# Altium schematic symbol library Regulator_Linear.SchLib: 1538 symbols (part 9 of 9) (continued)
## TPS76329 (continued)
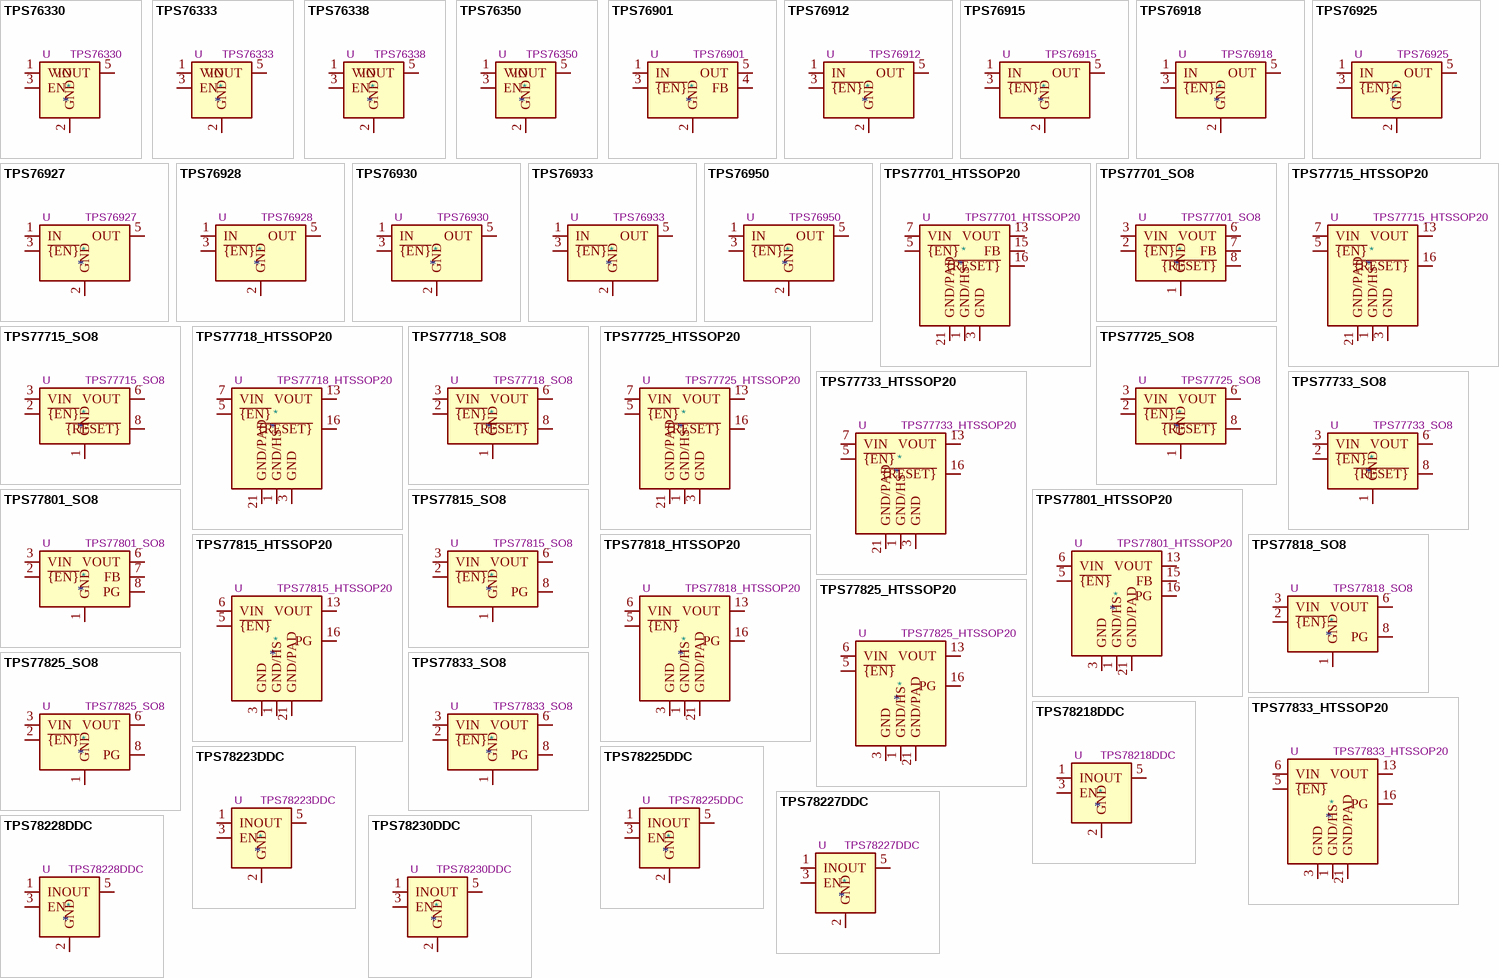
[diagram p37: symbols TPS76330 to TPS78230DDC]

## TPS76330
designator *  value TPS76330  Reference: U
ki_keywords: linear low dropout Regulator fixed; ki_description: Low power 150mA LDO 3.0V fixed output voltage, SOT-23-5; ki_fp_filters: SOT?23*; Footprint: Package_TO_SOT_SMD:SOT-23-5; Datasheet: http://www.ti.com/lit/ds/symlink/tps763.pdf
pins: 1 VIN, 2 GND, 3 EN, 4 NC hidden, 5 VOUT

## TPS76333
designator *  value TPS76333  Reference: U
ki_keywords: linear low dropout Regulator fixed; ki_description: Low power 150mA LDO 3.3V fixed output voltage, SOT-23-5; ki_fp_filters: SOT?23*; Footprint: Package_TO_SOT_SMD:SOT-23-5; Datasheet: http://www.ti.com/lit/ds/symlink/tps763.pdf
pins: 1 VIN, 2 GND, 3 EN, 4 NC hidden, 5 VOUT

## TPS76338
designator *  value TPS76338  Reference: U
ki_keywords: linear low dropout Regulator fixed; ki_description: Low power 150mA LDO 3.8V fixed output voltage, SOT-23-5; ki_fp_filters: SOT?23*; Footprint: Package_TO_SOT_SMD:SOT-23-5; Datasheet: http://www.ti.com/lit/ds/symlink/tps763.pdf
pins: 1 VIN, 2 GND, 3 EN, 4 NC hidden, 5 VOUT

## TPS76350
designator *  value TPS76350  Reference: U
ki_keywords: linear low dropout Regulator fixed; ki_description: Low power 150mA LDO 5.0V fixed output voltage, SOT-23-5; ki_fp_filters: SOT?23*; Footprint: Package_TO_SOT_SMD:SOT-23-5; Datasheet: http://www.ti.com/lit/ds/symlink/tps763.pdf
pins: 1 VIN, 2 GND, 3 EN, 4 NC hidden, 5 VOUT

## TPS76901
designator *  value TPS76901  Reference: U
ki_keywords: Ultra Low Power Adjustable LDO 100mA; ki_description: Ultra Low Power 100mA Low Drop Adjustable Out Regulator, SOT-23-5; ki_fp_filters: SOT?23*; Footprint: Package_TO_SOT_SMD:SOT-23-5; Datasheet: http://www.ti.com/lit/ds/symlink/tps769.pdf
pins: 1 IN, 2 GND, 3 ~{{EN}}, 4 FB, 5 OUT

## TPS76912
designator *  value TPS76912  Reference: U
ki_keywords: Ultra Low Power Fixed LDO 100mA; ki_description: Ultra Low Power 100mA Low Drop Out Regulator 1.2V, SOT-23-5; ki_fp_filters: SOT?23*; Footprint: Package_TO_SOT_SMD:SOT-23-5; Datasheet: http://www.ti.com/lit/ds/symlink/tps769.pdf
pins: 1 IN, 2 GND, 3 ~{{EN}}, 4 NC hidden, 5 OUT

## TPS76915
designator *  value TPS76915  Reference: U
ki_keywords: Ultra Low Power Fixed LDO 100mA; ki_description: Ultra Low Power 100mA Low Drop Out Regulator 1.5V, SOT-23-5; ki_fp_filters: SOT?23*; Footprint: Package_TO_SOT_SMD:SOT-23-5; Datasheet: http://www.ti.com/lit/ds/symlink/tps769.pdf
pins: 1 IN, 2 GND, 3 ~{{EN}}, 4 NC hidden, 5 OUT

## TPS76918
designator *  value TPS76918  Reference: U
ki_keywords: Ultra Low Power Fixed LDO 100mA; ki_description: Ultra Low Power 100mA Low Drop Out Regulator 1.8V, SOT-23-5; ki_fp_filters: SOT?23*; Footprint: Package_TO_SOT_SMD:SOT-23-5; Datasheet: http://www.ti.com/lit/ds/symlink/tps769.pdf
pins: 1 IN, 2 GND, 3 ~{{EN}}, 4 NC hidden, 5 OUT

## TPS76925
designator *  value TPS76925  Reference: U
ki_keywords: Ultra Low Power Fixed LDO 100mA; ki_description: Ultra Low Power 100mA Low Drop Out Regulator 2.5V, SOT-23-5; ki_fp_filters: SOT?23*; Footprint: Package_TO_SOT_SMD:SOT-23-5; Datasheet: http://www.ti.com/lit/ds/symlink/tps769.pdf
pins: 1 IN, 2 GND, 3 ~{{EN}}, 4 NC hidden, 5 OUT

## TPS76927
designator *  value TPS76927  Reference: U
ki_keywords: Ultra Low Power Fixed LDO 100mA; ki_description: Ultra Low Power 100mA Low Drop Out Regulator 2.7V, SOT-23-5; ki_fp_filters: SOT?23*; Footprint: Package_TO_SOT_SMD:SOT-23-5; Datasheet: http://www.ti.com/lit/ds/symlink/tps769.pdf
pins: 1 IN, 2 GND, 3 ~{{EN}}, 4 NC hidden, 5 OUT

## TPS76928
designator *  value TPS76928  Reference: U
ki_keywords: Ultra Low Power Fixed LDO 100mA; ki_description: Ultra Low Power 100mA Low Drop Out Regulator 2.8V, SOT-23-5; ki_fp_filters: SOT?23*; Footprint: Package_TO_SOT_SMD:SOT-23-5; Datasheet: http://www.ti.com/lit/ds/symlink/tps769.pdf
pins: 1 IN, 2 GND, 3 ~{{EN}}, 4 NC hidden, 5 OUT

## TPS76930
designator *  value TPS76930  Reference: U
ki_keywords: Ultra Low Power Fixed LDO 100mA; ki_description: Ultra Low Power 100mA Low Drop Out Regulator 3.0V, SOT-23-5; ki_fp_filters: SOT?23*; Footprint: Package_TO_SOT_SMD:SOT-23-5; Datasheet: http://www.ti.com/lit/ds/symlink/tps769.pdf
pins: 1 IN, 2 GND, 3 ~{{EN}}, 4 NC hidden, 5 OUT

## TPS76933
designator *  value TPS76933  Reference: U
ki_keywords: Ultra Low Power Fixed LDO 100mA; ki_description: Ultra Low Power 100mA Low Drop Out Regulator 3.3V, SOT-23-5; ki_fp_filters: SOT?23*; Footprint: Package_TO_SOT_SMD:SOT-23-5; Datasheet: http://www.ti.com/lit/ds/symlink/tps769.pdf
pins: 1 IN, 2 GND, 3 ~{{EN}}, 4 NC hidden, 5 OUT

## TPS76950
designator *  value TPS76950  Reference: U
ki_keywords: Ultra Low Power Fixed LDO 100mA 5V; ki_description: Ultra Low Power 100mA Low Drop Out Regulator 5.0V, SOT-23-5; ki_fp_filters: SOT?23*; Footprint: Package_TO_SOT_SMD:SOT-23-5; Datasheet: http://www.ti.com/lit/ds/symlink/tps769.pdf
pins: 1 IN, 2 GND, 3 ~{{EN}}, 4 NC hidden, 5 OUT

## TPS77701_HTSSOP20
designator *  value TPS77701_HTSSOP20  Reference: U
ki_keywords: 750mA LDO Regulator Adjustable Positive; ki_description: 750mA Fast-Transient Low Dropout Voltage Regulator, Adjustable Output 1.5-5.5V, HTSSOP20; ki_fp_filters: HTSSOP*4.4x6.5mm*P0.65mm*; Footprint: Package_SO:HTSSOP-20-1EP_4.4x6.5mm_P0.65mm_EP3.4x6.5mm_ThermalVias; Datasheet: http://www.ti.com/lit/ds/symlink/tps777.pdf
pins: 1 GND/HS, 2 GND/HS hidden, 3 GND, 4 NC hidden, 5 ~{{EN}}, 6 VIN hidden, 7 VIN, 8 NC hidden, 9 GND/HS hidden, 10 GND/HS hidden, 11 GND/HS hidden, 12 GND/HS hidden, 13 VOUT, 14 VOUT hidden, 15 FB, 16 ~{{RESET}}, 17 NC hidden, 18 NC hidden, 19 GND/HS hidden, 20 GND/HS hidden, 21 GND/PAD

## TPS77701_SO8
designator *  value TPS77701_SO8  Reference: U
ki_keywords: 750mA LDO Regulator Adjustable Positive; ki_description: 750mA Fast-Transient Low Dropout Voltage Regulator, Adjustable Output 1.5-5.5V, SO-8; ki_fp_filters: SOIC*3.9x4.9mm*P1.27mm*; Footprint: Package_SO:SOIC-8_3.9x4.9mm_P1.27mm; Datasheet: http://www.ti.com/lit/ds/symlink/tps777.pdf
pins: 1 GND, 2 ~{{EN}}, 3 VIN, 4 VIN hidden, 5 VOUT hidden, 6 VOUT, 7 FB, 8 ~{{RESET}}

## TPS77715_HTSSOP20
designator *  value TPS77715_HTSSOP20  Reference: U
ki_keywords: 750mA LDO Regulator Fixed Positive; ki_description: 750mA Fast-Transient Low Dropout Voltage Regulator, Fixed Output 1.5V, HTSSOP20; ki_fp_filters: HTSSOP*4.4x6.5mm*P0.65mm*; Footprint: Package_SO:HTSSOP-20-1EP_4.4x6.5mm_P0.65mm_EP3.4x6.5mm_ThermalVias; Datasheet: http://www.ti.com/lit/ds/symlink/tps777.pdf
pins: 1 GND/HS, 2 GND/HS hidden, 3 GND, 4 NC hidden, 5 ~{{EN}}, 6 VIN hidden, 7 VIN, 8 NC hidden, 9 GND/HS hidden, 10 GND/HS hidden, 11 GND/HS hidden, 12 GND/HS hidden, 13 VOUT, 14 VOUT hidden, 15 NC hidden, 16 ~{{RESET}}, 17 NC hidden, 18 NC hidden, 19 GND/HS hidden, 20 GND/HS hidden, 21 GND/PAD

## TPS77715_SO8
designator *  value TPS77715_SO8  Reference: U
ki_keywords: 750mA LDO Regulator Fixed Positive; ki_description: 750mA Fast-Transient Low Dropout Voltage Regulator, Fixed Output 1.5V, SO-8; ki_fp_filters: SOIC*3.9x4.9mm*P1.27mm*; Footprint: Package_SO:SOIC-8_3.9x4.9mm_P1.27mm; Datasheet: http://www.ti.com/lit/ds/symlink/tps777.pdf
pins: 1 GND, 2 ~{{EN}}, 3 VIN, 4 VIN hidden, 5 VOUT hidden, 6 VOUT, 7 NC hidden, 8 ~{{RESET}}

## TPS77718_HTSSOP20
designator *  value TPS77718_HTSSOP20  Reference: U
ki_keywords: 750mA LDO Regulator Fixed Positive; ki_description: 750mA Fast-Transient Low Dropout Voltage Regulator, Fixed Output 1.8V, HTSSOP20; ki_fp_filters: HTSSOP*4.4x6.5mm*P0.65mm*; Footprint: Package_SO:HTSSOP-20-1EP_4.4x6.5mm_P0.65mm_EP3.4x6.5mm_ThermalVias; Datasheet: http://www.ti.com/lit/ds/symlink/tps777.pdf
pins: 1 GND/HS, 2 GND/HS hidden, 3 GND, 4 NC hidden, 5 ~{{EN}}, 6 VIN hidden, 7 VIN, 8 NC hidden, 9 GND/HS hidden, 10 GND/HS hidden, 11 GND/HS hidden, 12 GND/HS hidden, 13 VOUT, 14 VOUT hidden, 15 NC hidden, 16 ~{{RESET}}, 17 NC hidden, 18 NC hidden, 19 GND/HS hidden, 20 GND/HS hidden, 21 GND/PAD

## TPS77718_SO8
designator *  value TPS77718_SO8  Reference: U
ki_keywords: 750mA LDO Regulator Fixed Positive; ki_description: 750mA Fast-Transient Low Dropout Voltage Regulator, Fixed Output 1.8V, SO-8; ki_fp_filters: SOIC*3.9x4.9mm*P1.27mm*; Footprint: Package_SO:SOIC-8_3.9x4.9mm_P1.27mm; Datasheet: http://www.ti.com/lit/ds/symlink/tps777.pdf
pins: 1 GND, 2 ~{{EN}}, 3 VIN, 4 VIN hidden, 5 VOUT hidden, 6 VOUT, 7 NC hidden, 8 ~{{RESET}}

## TPS77725_HTSSOP20
designator *  value TPS77725_HTSSOP20  Reference: U
ki_keywords: 750mA LDO Regulator Fixed Positive; ki_description: 750mA Fast-Transient Low Dropout Voltage Regulator, Fixed Output 2.5V, HTSSOP20; ki_fp_filters: HTSSOP*4.4x6.5mm*P0.65mm*; Footprint: Package_SO:HTSSOP-20-1EP_4.4x6.5mm_P0.65mm_EP3.4x6.5mm_ThermalVias; Datasheet: http://www.ti.com/lit/ds/symlink/tps777.pdf
pins: 1 GND/HS, 2 GND/HS hidden, 3 GND, 4 NC hidden, 5 ~{{EN}}, 6 VIN hidden, 7 VIN, 8 NC hidden, 9 GND/HS hidden, 10 GND/HS hidden, 11 GND/HS hidden, 12 GND/HS hidden, 13 VOUT, 14 VOUT hidden, 15 NC hidden, 16 ~{{RESET}}, 17 NC hidden, 18 NC hidden, 19 GND/HS hidden, 20 GND/HS hidden, 21 GND/PAD

## TPS77725_SO8
designator *  value TPS77725_SO8  Reference: U
ki_keywords: 750mA LDO Regulator Fixed Positive; ki_description: 750mA Fast-Transient Low Dropout Voltage Regulator, Fixed Output 2.5V, SO-8; ki_fp_filters: SOIC*3.9x4.9mm*P1.27mm*; Footprint: Package_SO:SOIC-8_3.9x4.9mm_P1.27mm; Datasheet: http://www.ti.com/lit/ds/symlink/tps777.pdf
pins: 1 GND, 2 ~{{EN}}, 3 VIN, 4 VIN hidden, 5 VOUT hidden, 6 VOUT, 7 NC hidden, 8 ~{{RESET}}

## TPS77733_HTSSOP20
designator *  value TPS77733_HTSSOP20  Reference: U
ki_keywords: 750mA LDO Regulator Fixed Positive; ki_description: 750mA Fast-Transient Low Dropout Voltage Regulator, Fixed Output 3.3V, HTSSOP20; ki_fp_filters: HTSSOP*4.4x6.5mm*P0.65mm*; Footprint: Package_SO:HTSSOP-20-1EP_4.4x6.5mm_P0.65mm_EP3.4x6.5mm_ThermalVias; Datasheet: http://www.ti.com/lit/ds/symlink/tps777.pdf
pins: 1 GND/HS, 2 GND/HS hidden, 3 GND, 4 NC hidden, 5 ~{{EN}}, 6 VIN hidden, 7 VIN, 8 NC hidden, 9 GND/HS hidden, 10 GND/HS hidden, 11 GND/HS hidden, 12 GND/HS hidden, 13 VOUT, 14 VOUT hidden, 15 NC hidden, 16 ~{{RESET}}, 17 NC hidden, 18 NC hidden, 19 GND/HS hidden, 20 GND/HS hidden, 21 GND/PAD

## TPS77733_SO8
designator *  value TPS77733_SO8  Reference: U
ki_keywords: 750mA LDO Regulator Fixed Positive; ki_description: 750mA Fast-Transient Low Dropout Voltage Regulator, Fixed Output 3.3V, SO-8; ki_fp_filters: SOIC*3.9x4.9mm*P1.27mm*; Footprint: Package_SO:SOIC-8_3.9x4.9mm_P1.27mm; Datasheet: http://www.ti.com/lit/ds/symlink/tps777.pdf
pins: 1 GND, 2 ~{{EN}}, 3 VIN, 4 VIN hidden, 5 VOUT hidden, 6 VOUT, 7 NC hidden, 8 ~{{RESET}}

## TPS77801_HTSSOP20
designator *  value TPS77801_HTSSOP20  Reference: U
ki_keywords: 750mA LDO Regulator Adjustable Positive; ki_description: 750mA Fast-Transient Low Dropout Voltage Regulator, Adjustable Output 1.2-5.5V, HTSSOP20; ki_fp_filters: HTSSOP*4.4x6.5mm*P0.65mm*; Footprint: Package_SO:HTSSOP-20-1EP_4.4x6.5mm_P0.65mm_EP3.4x6.5mm_ThermalVias; Datasheet: http://www.ti.com/lit/ds/symlink/tps777.pdf
pins: 1 GND/HS, 2 GND/HS hidden, 3 GND, 4 NC hidden, 5 ~{{EN}}, 6 VIN, 7 VIN hidden, 8 NC hidden, 9 GND/HS hidden, 10 GND/HS hidden, 11 GND/HS hidden, 12 GND/HS hidden, 13 VOUT, 14 VOUT hidden, 15 FB, 16 PG, 17 NC hidden, 18 NC hidden, 19 GND/HS hidden, 20 GND/HS hidden, 21 GND/PAD

## TPS77801_SO8
designator *  value TPS77801_SO8  Reference: U
ki_keywords: 750mA LDO Regulator Adjustable Positive; ki_description: 750mA Fast-Transient Low Dropout Voltage Regulator, Adjustable Output 1.2-5.5V, SO-8; ki_fp_filters: SOIC*3.9x4.9mm*P1.27mm*; Footprint: Package_SO:SOIC-8_3.9x4.9mm_P1.27mm; Datasheet: http://www.ti.com/lit/ds/symlink/tps777.pdf
pins: 1 GND, 2 ~{{EN}}, 3 VIN, 4 VIN hidden, 5 VOUT hidden, 6 VOUT, 7 FB, 8 PG

## TPS77815_HTSSOP20
designator *  value TPS77815_HTSSOP20  Reference: U
ki_keywords: 750mA LDO Regulator Fixed Positive; ki_description: 750mA Fast-Transient Low Dropout Voltage Regulator, Fixed Output 1.5V, HTSSOP20; ki_fp_filters: HTSSOP*4.4x6.5mm*P0.65mm*; Footprint: Package_SO:HTSSOP-20-1EP_4.4x6.5mm_P0.65mm_EP3.4x6.5mm_ThermalVias; Datasheet: http://www.ti.com/lit/ds/symlink/tps777.pdf
pins: 1 GND/HS, 2 GND/HS hidden, 3 GND, 4 NC hidden, 5 ~{{EN}}, 6 VIN, 7 VIN hidden, 8 NC hidden, 9 GND/HS hidden, 10 GND/HS hidden, 11 GND/HS hidden, 12 GND/HS hidden, 13 VOUT, 14 VOUT hidden, 15 NC hidden, 16 PG, 17 NC hidden, 18 NC hidden, 19 GND/HS hidden, 20 GND/HS hidden, 21 GND/PAD

## TPS77815_SO8
designator *  value TPS77815_SO8  Reference: U
ki_keywords: 750mA LDO Regulator Fixed Positive; ki_description: 750mA Fast-Transient Low Dropout Voltage Regulator, Fixed Output 1.5V, SO-8; ki_fp_filters: SOIC*3.9x4.9mm*P1.27mm*; Footprint: Package_SO:SOIC-8_3.9x4.9mm_P1.27mm; Datasheet: http://www.ti.com/lit/ds/symlink/tps777.pdf
pins: 1 GND, 2 ~{{EN}}, 3 VIN, 4 VIN hidden, 5 VOUT hidden, 6 VOUT, 7 NC hidden, 8 PG

## TPS77818_HTSSOP20
designator *  value TPS77818_HTSSOP20  Reference: U
ki_keywords: 750mA LDO Regulator Fixed Positive; ki_description: 750mA Fast-Transient Low Dropout Voltage Regulator, Fixed Output 1.8V, HTSSOP20; ki_fp_filters: HTSSOP*4.4x6.5mm*P0.65mm*; Footprint: Package_SO:HTSSOP-20-1EP_4.4x6.5mm_P0.65mm_EP3.4x6.5mm_ThermalVias; Datasheet: http://www.ti.com/lit/ds/symlink/tps777.pdf
pins: 1 GND/HS, 2 GND/HS hidden, 3 GND, 4 NC hidden, 5 ~{{EN}}, 6 VIN, 7 VIN hidden, 8 NC hidden, 9 GND/HS hidden, 10 GND/HS hidden, 11 GND/HS hidden, 12 GND/HS hidden, 13 VOUT, 14 VOUT hidden, 15 NC hidden, 16 PG, 17 NC hidden, 18 NC hidden, 19 GND/HS hidden, 20 GND/HS hidden, 21 GND/PAD

## TPS77818_SO8
designator *  value TPS77818_SO8  Reference: U
ki_keywords: 750mA LDO Regulator Fixed Positive; ki_description: 750mA Fast-Transient Low Dropout Voltage Regulator, Fixed Output 1.8V, SO-8; ki_fp_filters: SOIC*3.9x4.9mm*P1.27mm*; Footprint: Package_SO:SOIC-8_3.9x4.9mm_P1.27mm; Datasheet: http://www.ti.com/lit/ds/symlink/tps777.pdf
pins: 1 GND, 2 ~{{EN}}, 3 VIN, 4 VIN hidden, 5 VOUT hidden, 6 VOUT, 7 NC hidden, 8 PG

## TPS77825_HTSSOP20
designator *  value TPS77825_HTSSOP20  Reference: U
ki_keywords: 750mA LDO Regulator Fixed Positive; ki_description: 750mA Fast-Transient Low Dropout Voltage Regulator, Fixed Output 2.5V, HTSSOP20; ki_fp_filters: HTSSOP*4.4x6.5mm*P0.65mm*; Footprint: Package_SO:HTSSOP-20-1EP_4.4x6.5mm_P0.65mm_EP3.4x6.5mm_ThermalVias; Datasheet: http://www.ti.com/lit/ds/symlink/tps777.pdf
pins: 1 GND/HS, 2 GND/HS hidden, 3 GND, 4 NC hidden, 5 ~{{EN}}, 6 VIN, 7 VIN hidden, 8 NC hidden, 9 GND/HS hidden, 10 GND/HS hidden, 11 GND/HS hidden, 12 GND/HS hidden, 13 VOUT, 14 VOUT hidden, 15 NC hidden, 16 PG, 17 NC hidden, 18 NC hidden, 19 GND/HS hidden, 20 GND/HS hidden, 21 GND/PAD

## TPS77825_SO8
designator *  value TPS77825_SO8  Reference: U
ki_keywords: 750mA LDO Regulator Fixed Positive; ki_description: 750mA Fast-Transient Low Dropout Voltage Regulator, Fixed Output 2.5V, SO-8; ki_fp_filters: SOIC*3.9x4.9mm*P1.27mm*; Footprint: Package_SO:SOIC-8_3.9x4.9mm_P1.27mm; Datasheet: http://www.ti.com/lit/ds/symlink/tps777.pdf
pins: 1 GND, 2 ~{{EN}}, 3 VIN, 4 VIN hidden, 5 VOUT hidden, 6 VOUT, 7 NC hidden, 8 PG

## TPS77833_HTSSOP20
designator *  value TPS77833_HTSSOP20  Reference: U
ki_keywords: 750mA LDO Regulator Fixed Positive; ki_description: 750mA Fast-Transient Low Dropout Voltage Regulator, Fixed Output 3.3V, HTSSOP20; ki_fp_filters: HTSSOP*4.4x6.5mm*P0.65mm*; Footprint: Package_SO:HTSSOP-20-1EP_4.4x6.5mm_P0.65mm_EP3.4x6.5mm_ThermalVias; Datasheet: http://www.ti.com/lit/ds/symlink/tps777.pdf
pins: 1 GND/HS, 2 GND/HS hidden, 3 GND, 4 NC hidden, 5 ~{{EN}}, 6 VIN, 7 VIN hidden, 8 NC hidden, 9 GND/HS hidden, 10 GND/HS hidden, 11 GND/HS hidden, 12 GND/HS hidden, 13 VOUT, 14 VOUT hidden, 15 NC hidden, 16 PG, 17 NC hidden, 18 NC hidden, 19 GND/HS hidden, 20 GND/HS hidden, 21 GND/PAD

## TPS77833_SO8
designator *  value TPS77833_SO8  Reference: U
ki_keywords: 750mA LDO Regulator Fixed Positive; ki_description: 750mA Fast-Transient Low Dropout Voltage Regulator, Fixed Output 3.3V, SO-8; ki_fp_filters: SOIC*3.9x4.9mm*P1.27mm*; Footprint: Package_SO:SOIC-8_3.9x4.9mm_P1.27mm; Datasheet: http://www.ti.com/lit/ds/symlink/tps777.pdf
pins: 1 GND, 2 ~{{EN}}, 3 VIN, 4 VIN hidden, 5 VOUT hidden, 6 VOUT, 7 NC hidden, 8 PG

## TPS78218DDC
designator *  value TPS78218DDC  Reference: U
ki_keywords: Single Output LDO Low-Iq; ki_description: 150-mA, 500nA Ultra-Low-IQ LDO, 1.8V, SOT-23-5; ki_fp_filters: SOT?23*; Footprint: Package_TO_SOT_SMD:SOT-23-5; Datasheet: http://www.ti.com/lit/gpn/tps782
pins: 1 IN, 2 GND, 3 EN, 4 GND hidden, 5 OUT

## TPS78223DDC
designator *  value TPS78223DDC  Reference: U
ki_keywords: Single Output LDO Low-Iq; ki_description: 150-mA, 500nA Ultra-Low-IQ LDO, 2.3V, SOT-23-5; ki_fp_filters: SOT?23*; Footprint: Package_TO_SOT_SMD:SOT-23-5; Datasheet: http://www.ti.com/lit/gpn/tps782
pins: 1 IN, 2 GND, 3 EN, 4 GND hidden, 5 OUT

## TPS78225DDC
designator *  value TPS78225DDC  Reference: U
ki_keywords: Single Output LDO Low-Iq; ki_description: 150-mA, 500nA Ultra-Low-IQ LDO, 2.5V, SOT-23-5; ki_fp_filters: SOT?23*; Footprint: Package_TO_SOT_SMD:SOT-23-5; Datasheet: http://www.ti.com/lit/gpn/tps782
pins: 1 IN, 2 GND, 3 EN, 4 GND hidden, 5 OUT

## TPS78227DDC
designator *  value TPS78227DDC  Reference: U
ki_keywords: Single Output LDO Low-Iq; ki_description: 150-mA, 500nA Ultra-Low-IQ LDO, 2.7V, SOT-23-5; ki_fp_filters: SOT?23*; Footprint: Package_TO_SOT_SMD:SOT-23-5; Datasheet: http://www.ti.com/lit/gpn/tps782
pins: 1 IN, 2 GND, 3 EN, 4 GND hidden, 5 OUT

## TPS78228DDC
designator *  value TPS78228DDC  Reference: U
ki_keywords: Single Output LDO Low-Iq; ki_description: 150-mA, 500nA Ultra-Low-IQ LDO, 2.8V, SOT-23-5; ki_fp_filters: SOT?23*; Footprint: Package_TO_SOT_SMD:SOT-23-5; Datasheet: http://www.ti.com/lit/gpn/tps782
pins: 1 IN, 2 GND, 3 EN, 4 GND hidden, 5 OUT

## TPS78230DDC
designator *  value TPS78230DDC  Reference: U
ki_keywords: Single Output LDO Low-Iq; ki_description: 150-mA, 500nA Ultra-Low-IQ LDO, 3.0V, SOT-23-5; ki_fp_filters: SOT?23*; Footprint: Package_TO_SOT_SMD:SOT-23-5; Datasheet: http://www.ti.com/lit/gpn/tps782
pins: 1 IN, 2 GND, 3 EN, 4 GND hidden, 5 OUT

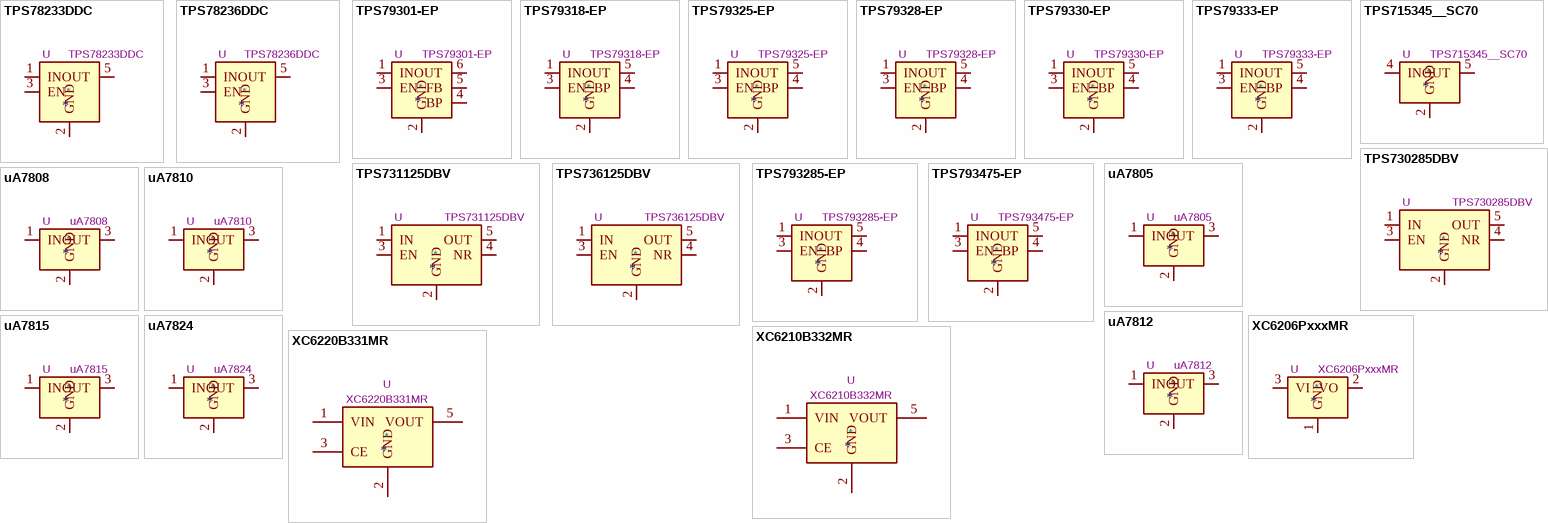
[diagram p38: symbols TPS78233DDC to XC6220B331MR]

## TPS78233DDC
designator *  value TPS78233DDC  Reference: U
ki_keywords: Single Output LDO Low-Iq; ki_description: 150-mA, 500nA Ultra-Low-IQ LDO, 3.3V, SOT-23-5; ki_fp_filters: SOT?23*; Footprint: Package_TO_SOT_SMD:SOT-23-5; Datasheet: http://www.ti.com/lit/gpn/tps782
pins: 1 IN, 2 GND, 3 EN, 4 GND hidden, 5 OUT

## TPS78236DDC
designator *  value TPS78236DDC  Reference: U
ki_keywords: Single Output LDO Low-Iq; ki_description: 150-mA, 500nA Ultra-Low-IQ LDO, 3.6V, SOT-23-5; ki_fp_filters: SOT?23*; Footprint: Package_TO_SOT_SMD:SOT-23-5; Datasheet: http://www.ti.com/lit/gpn/tps782
pins: 1 IN, 2 GND, 3 EN, 4 GND hidden, 5 OUT

## TPS79301-EP
designator *  value TPS79301-EP  Reference: U
ki_keywords: LDO Voltage Regulator 200mA adjustable; ki_description: 200mA UltraLow-Noise, High-Precision, Fast RF, Low Drop-out Voltage Regulator, Adjustable Output, SOT-23; ki_fp_filters: SOT?23*; Footprint: Package_TO_SOT_SMD:SOT-23-6; Datasheet: http://www.ti.com/lit/ds/symlink/tps79333-ep.pdf
pins: 1 IN, 2 GND, 3 EN, 4 BP, 5 FB, 6 OUT

## TPS79318-EP
designator *  value TPS79318-EP  Reference: U
ki_keywords: LDO Voltage Regulator 200mA; ki_description: 200mA UltraLow-Noise, High-Precision, Fast RF, Low Drop-out Voltage Regulator, Fixed Output 1.8V, SOT-23; ki_fp_filters: SOT?23*; Footprint: Package_TO_SOT_SMD:SOT-23-5; Datasheet: http://www.ti.com/lit/ds/symlink/tps79333-ep.pdf
pins: 1 IN, 2 GND, 3 EN, 4 BP, 5 OUT

## TPS79325-EP
designator *  value TPS79325-EP  Reference: U
ki_keywords: LDO Voltage Regulator 200mA; ki_description: 200mA UltraLow-Noise, High-Precision, Fast RF, Low Drop-out Voltage Regulator, Fixed Output 2.5V, SOT-23; ki_fp_filters: SOT?23*; Footprint: Package_TO_SOT_SMD:SOT-23-5; Datasheet: http://www.ti.com/lit/ds/symlink/tps79333-ep.pdf
pins: 1 IN, 2 GND, 3 EN, 4 BP, 5 OUT

## TPS79328-EP
designator *  value TPS79328-EP  Reference: U
ki_keywords: LDO Voltage Regulator 200mA; ki_description: 200mA UltraLow-Noise, High-Precision, Fast RF, Low Drop-out Voltage Regulator, Fixed Output 2.8V, SOT-23; ki_fp_filters: SOT?23*; Footprint: Package_TO_SOT_SMD:SOT-23-5; Datasheet: http://www.ti.com/lit/ds/symlink/tps79333-ep.pdf
pins: 1 IN, 2 GND, 3 EN, 4 BP, 5 OUT

## TPS79330-EP
designator *  value TPS79330-EP  Reference: U
ki_keywords: LDO Voltage Regulator 200mA; ki_description: 200mA UltraLow-Noise, High-Precision, Fast RF, Low Drop-out Voltage Regulator, Fixed Output 3.0V, SOT-23; ki_fp_filters: SOT?23*; Footprint: Package_TO_SOT_SMD:SOT-23-5; Datasheet: http://www.ti.com/lit/ds/symlink/tps79333-ep.pdf
pins: 1 IN, 2 GND, 3 EN, 4 BP, 5 OUT

## TPS79333-EP
designator *  value TPS79333-EP  Reference: U
ki_keywords: LDO Voltage Regulator 200mA; ki_description: 200mA UltraLow-Noise, High-Precision, Fast RF, Low Drop-out Voltage Regulator, Fixed Output 3.3V, SOT-23; ki_fp_filters: SOT?23*; Footprint: Package_TO_SOT_SMD:SOT-23-5; Datasheet: http://www.ti.com/lit/ds/symlink/tps79333-ep.pdf
pins: 1 IN, 2 GND, 3 EN, 4 BP, 5 OUT

## TPS715345__SC70
designator *  value TPS715345__SC70  Reference: U
ki_keywords: LDO regulator voltage; ki_description: Low-drop Voltage Regulator, Io up to 50mA, Fixed Vo 3.45V, Ignd 3.2uA , SC70.; ki_fp_filters: *SC?70*; Footprint: Package_TO_SOT_SMD:SOT-353_SC-70-5; Datasheet: http://www.ti.com/lit/ds/symlink/tps715.pdf
pins: 1 NC hidden, 2 GND, 3 NC hidden, 4 IN, 5 OUT

## TPS730285DBV
designator *  value TPS730285DBV  Reference: U
ki_keywords: Fixed LDO 200mA; ki_description: Low Noise, High PSRR, 200mA Low Drop 2.85V Regulator, SOT-23-5; ki_fp_filters: SOT?23*; Footprint: Package_TO_SOT_SMD:SOT-23-5; Datasheet: https://www.ti.com/lit/ds/symlink/tps730.pdf
pins: 1 IN, 2 GND, 3 EN, 4 NR, 5 OUT

## TPS731125DBV
designator *  value TPS731125DBV  Reference: U
ki_keywords: Cap free Fixed LDO 150mA; ki_description: Cap free NMOS 150mA Low Drop 1.25V Regulator, SOT-23-5; ki_fp_filters: SOT?23*; Footprint: Package_TO_SOT_SMD:SOT-23-5; Datasheet: http://www.ti.com/lit/ds/symlink/tps731.pdf
pins: 1 IN, 2 GND, 3 EN, 4 NR, 5 OUT

## TPS736125DBV
designator *  value TPS736125DBV  Reference: U
ki_keywords: Cap free Fixed LDO 400mA; ki_description: Cap free NMOS 400mA Low Drop 1.25V Regulator, SOT-23-5; ki_fp_filters: SOT?23*; Footprint: Package_TO_SOT_SMD:SOT-23-5; Datasheet: http://www.ti.com/lit/ds/symlink/tps736.pdf
pins: 1 IN, 2 GND, 3 EN, 4 NR, 5 OUT

## TPS793285-EP
designator *  value TPS793285-EP  Reference: U
ki_keywords: LDO Voltage Regulator 200mA; ki_description: 200mA UltraLow-Noise, High-Precision, Fast RF, Low Drop-out Voltage Regulator, Fixed Output 2.85V, SOT-23; ki_fp_filters: SOT?23*; Footprint: Package_TO_SOT_SMD:SOT-23-5; Datasheet: http://www.ti.com/lit/ds/symlink/tps79333-ep.pdf
pins: 1 IN, 2 GND, 3 EN, 4 BP, 5 OUT

## TPS793475-EP
designator *  value TPS793475-EP  Reference: U
ki_keywords: LDO Voltage Regulator 200mA; ki_description: 200mA UltraLow-Noise, High-Precision, Fast RF, Low Drop-out Voltage Regulator, Fixed Output 4.75V, SOT-23; ki_fp_filters: SOT?23*; Footprint: Package_TO_SOT_SMD:SOT-23-5; Datasheet: http://www.ti.com/lit/ds/symlink/tps79333-ep.pdf
pins: 1 IN, 2 GND, 3 EN, 4 BP, 5 OUT

## uA7805
designator *  value uA7805  Reference: U
ki_keywords: Voltage Regulator 1A Positive; ki_description: Positive 1A 35V Linear Regulator, Fixed Output 5V, TO-220/TO-263; ki_fp_filters: TO?263* TO?220*; Datasheet: http://www.ti.com/lit/ds/symlink/ua78.pdf
pins: 1 IN, 2 GND, 3 OUT

## uA7808
designator *  value uA7808  Reference: U
ki_keywords: Voltage Regulator 1A Positive; ki_description: Positive 1A 35V Linear Regulator, Fixed Output 8V, TO-220/TO-263; ki_fp_filters: TO?263* TO?220*; Datasheet: http://www.ti.com/lit/ds/symlink/ua78.pdf
pins: 1 IN, 2 GND, 3 OUT

## uA7810
designator *  value uA7810  Reference: U
ki_keywords: Voltage Regulator 1A Positive; ki_description: Positive 1A 35V Linear Regulator, Fixed Output 10V, TO-220/TO-263; ki_fp_filters: TO?263* TO?220*; Datasheet: http://www.ti.com/lit/ds/symlink/ua78.pdf
pins: 1 IN, 2 GND, 3 OUT

## uA7812
designator *  value uA7812  Reference: U
ki_keywords: Voltage Regulator 1A Positive; ki_description: Positive 1A 35V Linear Regulator, Fixed Output 12V, TO-220/TO-263; ki_fp_filters: TO?263* TO?220*; Datasheet: http://www.ti.com/lit/ds/symlink/ua78.pdf
pins: 1 IN, 2 GND, 3 OUT

## uA7815
designator *  value uA7815  Reference: U
ki_keywords: Voltage Regulator 1A Positive; ki_description: Positive 1A 35V Linear Regulator, Fixed Output 15V, TO-220/TO-263; ki_fp_filters: TO?263* TO?220*; Datasheet: http://www.ti.com/lit/ds/symlink/ua78.pdf
pins: 1 IN, 2 GND, 3 OUT

## uA7824
designator *  value uA7824  Reference: U
ki_keywords: Voltage Regulator 1A Positive; ki_description: Positive 1A 35V Linear Regulator, Fixed Output 24V, TO-220/TO-263; ki_fp_filters: TO?263* TO?220*; Datasheet: http://www.ti.com/lit/ds/symlink/ua78.pdf
pins: 1 IN, 2 GND, 3 OUT

## XC6206PxxxMR
designator *  value XC6206PxxxMR  Reference: U
ki_keywords: Torex LDO Voltage Regulator Fixed Positive; ki_description: Positive 60-250mA Low Dropout Regulator, Fixed Output, SOT-23; ki_fp_filters: SOT?23?3*; Footprint: Package_TO_SOT_SMD:SOT-23-3; Datasheet: https://www.torexsemi.com/file/xc6206/XC6206.pdf
pins: 1 GND, 2 VO, 3 VI

## XC6210B332MR
designator *  value XC6210B332MR  Reference: U
ki_keywords: LDO Voltage Regulator 700mA; ki_description: 700mA, Low Drop-out Voltage Regulator, Fixed Output 3.3V, SOT-23-5; ki_fp_filters: SOT?23*; Footprint: Package_TO_SOT_SMD:SOT-23-5; Datasheet: https://www.torexsemi.com/file/xc6210/XC6210.pdf
pins: 1 VIN, 2 GND, 3 CE, 4 NC hidden, 5 VOUT

## XC6220B331MR
designator *  value XC6220B331MR  Reference: U
ki_keywords: LDO Voltage Regulator 1A; ki_description: 1A, Low Drop-out Voltage Regulator, Fixed Output 3.3V, SOT-23-5; ki_fp_filters: SOT?23*; Footprint: Package_TO_SOT_SMD:SOT-23-5; Datasheet: https://www.torexsemi.com/file/xc6220/XC6220.pdf
pins: 1 VIN, 2 GND, 3 CE, 4 NC hidden, 5 VOUT